# Altium footprint library Tienanh.PcbLib: 190 footprints (part 2 of 12)
Each footprint in its own frame and in the unit in brackets; x right, y up, seen from the top. Pads: shape width x height; smd on the part's side, far side on the other; paste and mask are expansions set on the pad; w line width, h text height; cw(c..) or ccw(c..) is an arc to the next point about the centre after c.
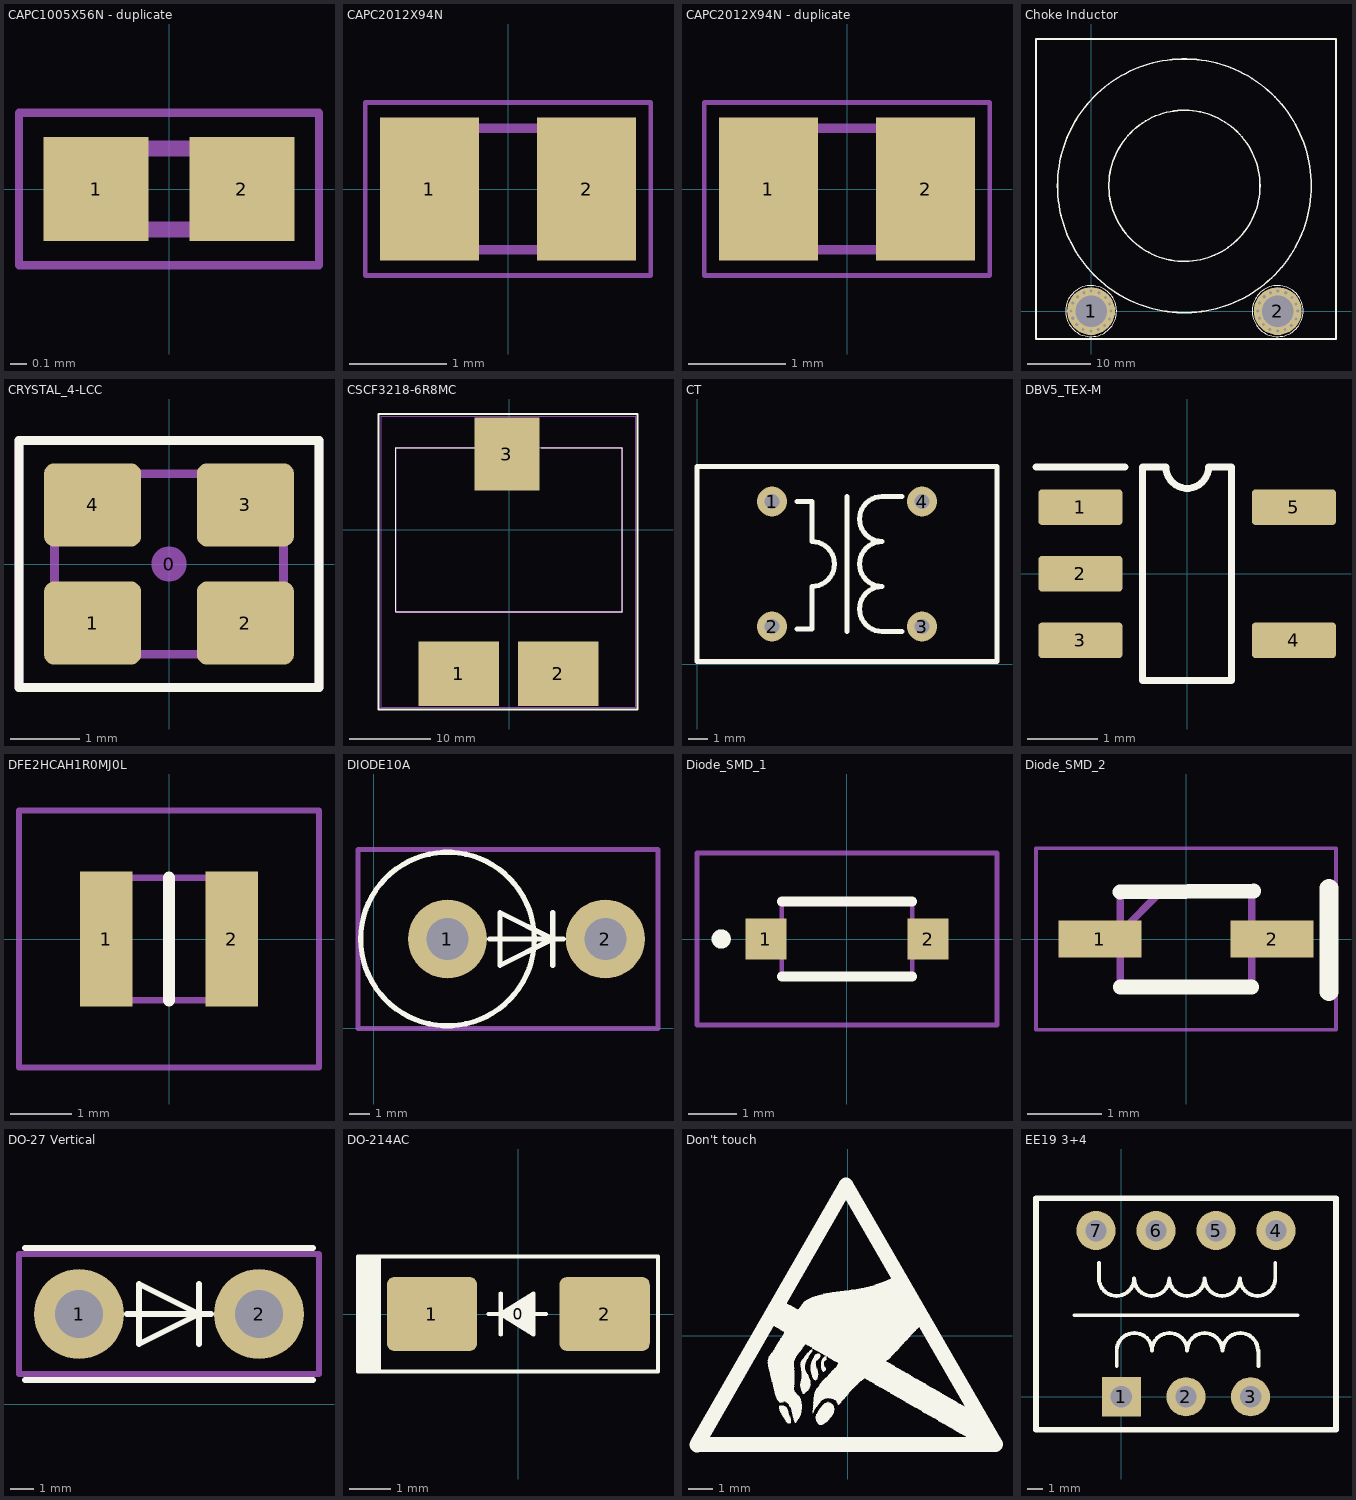
[diagram p1: the footprints below, top view; thin cyan lines are the x and y axes]

## CAPC1005X56N - duplicate [mm]
pads (2):
  rect 0.65x0.64 smd: 1(-0.45,0) 2(0.45,0)
Mechanical 13:
  lines w0.1: -0.5,-0.25 -0.5,0.25 0.5,0.25 0.5,-0.25 -0.5,-0.25
Mechanical 15:
  lines w0.05: -0.925,-0.47 -0.925,0.47 0.925,0.47 0.925,-0.47 -0.925,-0.47
3D body "0402ZD225MAT2A.stp": height 0.56, standoff 0, extent -0.5,-0.25 0.5,0.25

## CAPC2012X94N [mm]
pads (2):
  rect 1.02x1.47 smd: 1(-0.81,0) 2(0.81,0)
Mechanical 13:
  lines w0.1: -1.005,-0.625 -1.005,0.625 1.005,0.625 1.005,-0.625 -1.005,-0.625
Mechanical 15:
  lines w0.05: -1.47,-0.89 -1.47,0.89 1.47,0.89 1.47,-0.89 -1.47,-0.89
3D body "08055A150JAT2A.stp": height 0.94, standoff 0, extent -1.005,-0.625 1.005,0.625

## CAPC2012X94N - duplicate [mm]
pads (2):
  rect 1.02x1.47 smd: 1(-0.81,0) 2(0.81,0)
Mechanical 13:
  lines w0.1: -1.005,-0.625 -1.005,0.625 1.005,0.625 1.005,-0.625 -1.005,-0.625
Mechanical 15:
  lines w0.05: -1.47,-0.89 -1.47,0.89 1.47,0.89 1.47,-0.89 -1.47,-0.89
3D body "08055A150JAT2A.stp": height 0.94, standoff 0, extent -1.005,-0.625 1.005,0.625

## Choke Inductor [mm]
pads (2):
  round 7.62 hole 5 mask+0: 1(0,0) 2(29.718,0)
via 2.286,2.159 diameter 0.762 hole 0.508
via 2.921,1.143 diameter 0.762 hole 0.508
via 1.27,2.921 diameter 0.762 hole 0.508
via -2.159,2.286 diameter 0.762 hole 0.508
via -2.921,1.27 diameter 0.762 hole 0.508
via -1.143,2.921 diameter 0.762 hole 0.508
via 0,3.175 diameter 0.762 hole 0.508
via -3.175,0 diameter 0.762 hole 0.508
via 2.159,-2.286 diameter 0.762 hole 0.508
via -2.921,-1.143 diameter 0.762 hole 0.508
via -1.27,-2.921 diameter 0.762 hole 0.508
via -2.286,-2.159 diameter 0.762 hole 0.508
via 0,-3.175 diameter 0.762 hole 0.508
via 1.143,-2.921 diameter 0.762 hole 0.508
via 3.175,0 diameter 0.762 hole 0.508
via 2.921,-1.27 diameter 0.762 hole 0.508
via 32.004,2.159 diameter 0.762 hole 0.508
via 32.639,1.143 diameter 0.762 hole 0.508
via 30.988,2.921 diameter 0.762 hole 0.508
via 27.559,2.286 diameter 0.762 hole 0.508
via 26.797,1.27 diameter 0.762 hole 0.508
via 28.575,2.921 diameter 0.762 hole 0.508
via 29.718,3.175 diameter 0.762 hole 0.508
via 26.543,0 diameter 0.762 hole 0.508
via 31.877,-2.286 diameter 0.762 hole 0.508
via 26.797,-1.143 diameter 0.762 hole 0.508
via 28.448,-2.921 diameter 0.762 hole 0.508
via 27.432,-2.159 diameter 0.762 hole 0.508
via 29.718,-3.175 diameter 0.762 hole 0.508
via 30.861,-2.921 diameter 0.762 hole 0.508
via 32.893,0 diameter 0.762 hole 0.508
via 32.639,-1.27 diameter 0.762 hole 0.508
Top Overlay:
  circle w0.1: c0,0 r4.064
  circle w0.254: c14.859,19.939 r20.193
  circle w0.254: c14.859,19.939 r12.028
  circle w0.1: c29.718,0 r4.064
  lines w0.254: -8.763,-4.445 -8.763,43.307 38.989,43.307 38.989,-4.445 -8.763,-4.445

## CRYSTAL_4-LCC [mm] "SMD Crystal 4-lead leadless package"
height 0.8
pads (5):
  round 0.508 on Mech14: 0(0,0)
  rrect25% 1.4x1.2 smd mask+0.07: 1(-1.1,-0.85) 2(1.1,-0.85) 3(1.1,0.85) 4(-1.1,0.85)
Top Overlay:
  lines w0.127: -2.159,-1.778 -2.159,1.778 2.159,1.778 2.159,-1.778 -2.159,-1.778
Mechanical 13:
  lines w0.127: -1.65,-1.143 -1.493,-1.3 1.493,-1.3 1.65,-1.143 1.65,1.144 1.494,1.3 -1.493,1.3 -1.65,1.143 -1.65,-1.143
Mechanical 14:
  lines w0.127: -2.159,-1.778 2.159,-1.778 2.159,1.778 -2.159,1.778 -2.159,-1.778
3D body "Crystal TXC Corp 7M series.STEP": height 0.8, standoff 0, extent -1.65,-1.3 1.65,1.3

## CSCF3218-6R8MC [mm]
pads (3):
  rect 10x8 smd: 1(-6.223,-17.78) 2(6.096,-17.78)
  rect 8x9 smd: 3(-0.254,9.398)
Top Overlay:
  lines w0.1: -14,-10.15 -14,10.15 ; -14,-10.15 -14,10.15 ; -14,-10.15 14,-10.15 ; -14,-10.15 14,-10.15 ; -14,10.15 -4,10.15 -14,10.15 ; 14,-10.15 14,10.15 ; 14,-10.15 14,10.15 ; 14,10.15 4,10.15 14,10.15
  lines w0.2: -5.2,-17.9 ccw(c-5.15,-17.9) -5.1,-17.9 ; -5.2,-17.9 cw(c-5.15,-17.9) -5.1,-17.9 ; -5.2,-17.9 ccw(c-5.15,-17.9) -5.1,-17.9
  lines w0.254: -16.129,-22.225 15.875,-22.225 15.875,14.351 -16.129,14.351 -16.129,-22.225
Mechanical 13:
  lines w0.2: -14,-10.15 14,-10.15 14,10.15 -14,10.15 -14,-10.15
Mechanical 15:
  lines w0.1: -15.875,-21.971 -15.875,14.097 15.621,14.097 15.621,-21.971 6.765,-21.971 1.668,-21.971 -1.668,-21.971 -6.765,-21.971 -15.875,-21.971
3D body "7443640330B.stp": height 18.25, standoff -0.27, extent -14,-16.4 14,10.6

## CT [mil]
pads (4):
  round 60 hole 30: 1(150,325) 2(150,75) 3(450,75) 4(450,325)
Top Overlay:
  lines w10: 200,70 230,70 230,155 ccw(c230,200) 230,245 230,325 200,325 ; 300,65 300,335 ; 410,65 370,65 cw(c370,110) 370,155 cw(c370,200) 370,245 cw(c370,290) 370,335 410,335 ; 0,5 0,395 600,395 600,5 0,5

## DBV5_TEX-M [mil]
pads (5):
  rrect20% 47.24x20 smd mask+2.76: 1(-60,37.4) 2(-60,0) 3(-60,-37.4) 4(60,-37.4) 5(60,37.4)
Top Overlay:
  lines w3.94: -85,60 -35,60 ; -25,-60 -25,60 -12,60 ccw(c0,60) 12,60 25,60 25,-60 -25,-60
3D body "SOT23-5_STM.step": height 57.09, standoff 0, extent -59.01,-59.01 59.02,59.02

## DFE2HCAH1R0MJ0L [mm]
pads (2):
  rect 0.85x2.2 smd: 1(-1.025,0) 2(1.025,0)
Top Overlay:
  lines w0.2: 0,-1 0,1
Mechanical 13:
  lines w0.1: -1.25,-1 -1.25,1 1.25,1 1.25,-1 -1.25,-1
Mechanical 15:
  lines w0.1: -2.45,-2.1 -2.45,2.1 2.45,2.1 2.45,-2.1 -2.45,-2.1
3D body "DFE252012F-4R7M=P2.stp": height 1.2, standoff 0, extent -1.25,-1 1.25,1

## DIODE10A [mil]
pads (2):
  round 150 hole 80: 1(140,170) 2(440,170)
Top Overlay:
  circle w10: c140,170 r164.92
  lines w10: 220,170 360,170 ; 340,120 340,220 ; 240,120 340,170 240,220 240,120
Mechanical 15:
  lines w10: -30,0 540,0 540,340 -30,340 -30,0

## Diode_SMD_1 [mm]
pads (2):
  rect 0.85x0.85 smd: 1(-1.675,0) 2(1.675,0)
Top Overlay:
  lines w0.2: -1.35,-0.775 1.35,-0.775 ; -1.35,0.775 1.35,0.775 ; -2.6,-0.1 ccw(c-2.6,0) -2.6,0.1 ccw(c-2.6,0) -2.6,-0.1
Mechanical 13:
  lines w0.1: -1.35,-0.775 -1.35,0.775 1.35,0.775 1.35,-0.775 -1.35,-0.775
Mechanical 15:
  lines w0.1: -3.1,-1.775 -3.1,1.775 3.1,1.775 3.1,-1.775 -3.1,-1.775
3D body "1N4148W-V-GS08.stp": height 1.26, standoff 0, extent -1.854,-0.775 1.854,0.775

## Diode_SMD_2 [mm]
pads (2):
  rect 1.125x0.5 smd: 1(-1.162,0) 2(1.162,0)
Top Overlay:
  lines w0.2: -0.889,0.635 0.913,0.65 ; -0.888,-0.65 0.888,-0.65
  lines w0.254: 1.93,-0.711 1.93,0.686
Mechanical 13:
  lines w0.1: -0.888,0.088 -0.325,0.65 ; -0.888,-0.65 0.888,-0.65 0.888,0.65 -0.888,0.65 -0.888,-0.65
Mechanical 15:
  lines w0.05: -2.025,-1.225 2.025,-1.225 2.025,1.225 -2.025,1.225 -2.025,-1.225
3D body "1N4148WS-E3-08.stp": height 1.15, standoff 0, extent -1.338,-0.65 1.338,0.65

## DO-27 Vertical [mil]
pads (2):
  round 150 hole 80: 1(150,150) 2(450,150)
Top Overlay:
  lines w10: 60,40 540,40 ; 60,260 540,260 ; 230,150 370,150 ; 350,100 350,200 ; 250,100 250,200 350,150 250,100
Mechanical 15:
  lines w10: 50,50 550,50 550,250 50,250 50,50

## DO-214AC [mm]
pads (3):
  round 0.508 on Mech14: 0(0,0)
  rrect20% 2.2x1.8 smd mask+0.07: 1(-2.1,0) 2(2.1,0)
Top Overlay:
  rectangle: -3.9,-1.4 -3.387,1.4
  region: 0.375,-0.5 0.375,0.5 -0.425,0
  lines w0.1: -0.725,0 -0.425,0 ; -0.425,-0.5 -0.425,0 ; -0.425,0.5 -0.425,0 ; 0.375,0 0.675,0 ; -0.425,0 0.375,0.5 0.375,-0.5 -0.425,0 ; -3.9,-1.4 -3.9,1.4 -3.687,1.4 -3.387,1.4 -3.387,-1.4 -3.9,-1.4 ; -3.4,-1.4 -3.4,1.4 3.4,1.4 3.4,-1.4 -3.4,-1.4
3D body "SW3dPS-DO-214AC SMA.STEP": height 2.42, standoff 0.02, extent -2.6,-1.3 2.6,1.3

## Don't touch [mm]
Top Overlay:
  drawing of 7 lines, arcs and shapes, not listed

## EE19 3+4 [mm] "5+5 pin"
pads (7):
  rect 2.54x2.54 hole 1.397: 1(0,0)
  round 2.54 hole 1.397: 2(4.2,0) 3(8.4,0) 4(10.05,10.8) 5(6.15,10.8) 6(2.25,10.8) 7(-1.65,10.8)
Top Overlay:
  lines w0.254: -3.05,5.3 11.45,5.3 ; -1.459,8.714 -1.459,7.698 ccw(c-0.316,7.698) 0.827,7.698 ccw(c1.97,7.698) 3.113,7.698 ccw(c4.256,7.698) 5.399,7.698 ; -0.299,1.986 -0.299,3.002 cw(c0.844,3.002) 1.987,3.002 cw(c3.13,3.002) 4.273,3.002 cw(c5.416,3.002) 6.559,3.002 ; 5.413,7.698 ccw(c6.556,7.698) 7.699,7.698 ; 6.587,3.002 cw(c7.73,3.002) 8.873,3.002 ; 7.713,7.698 ccw(c8.856,7.698) 9.999,7.698 9.999,8.714 ; 8.901,1.986 8.901,3.002
  lines w0.381: -5.55,-2.14 13.95,-2.14 13.95,12.9 -5.55,12.9 -5.55,-2.14